# Altium footprint library TarabusLibrary.PcbLib: 591 footprints (part 4 of 37)
Each footprint in its own frame and in the unit in brackets; x right, y up, seen from the top. Pads: shape width x height; smd on the part's side, far side on the other; paste and mask are expansions set on the pad; w line width, h text height; cw(c..) or ccw(c..) is an arc to the next point about the centre after c.
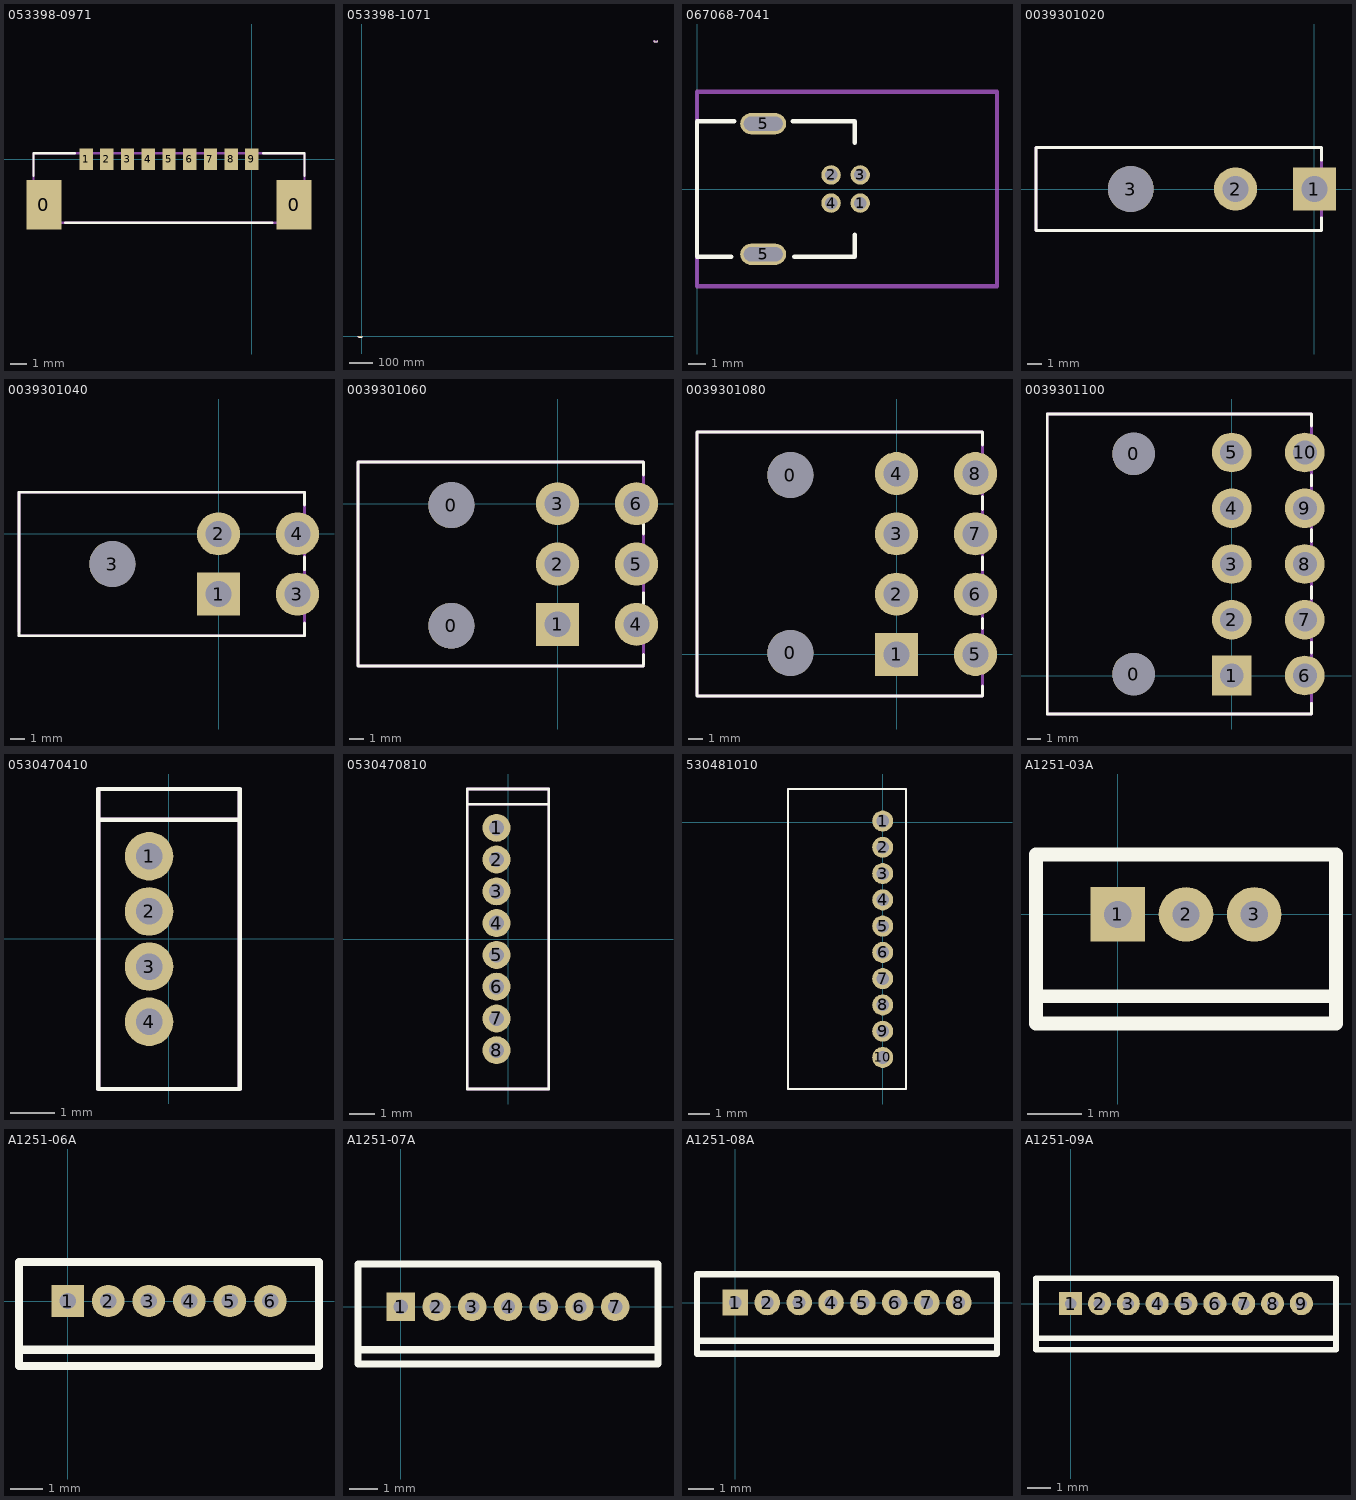
[diagram p3: the footprints below, top view; thin cyan lines are the x and y axes]

## 053398-0971 [mm]
pads (12):
  rect 2.1x3 smd: 0(-12.55,-2.75) 0(2.55,-2.75)
  rect 0.8x1.3 smd: 1(-10,0) 2(-8.75,0) 3(-7.5,0) 4(-6.25,0) 4(-6.25,0) 5(-5,0) 6(-3.75,0) 7(-2.5,0) 8(-1.25,0) 9(0,0)
Top Overlay:
  lines w0.15: -13.175,-1 -13.175,0.35 -10.7,0.35 ; -11.25,-3.85 1.225,-3.85 ; 0.7,0.35 3.175,0.35 3.175,-1
Mechanical 7:
  lines w0.15: -13.175,-3.85 -13.175,0.35 3.175,0.35 3.175,-3.85 -13.175,-3.85
Mechanical 10:
  text ".Designator" at -4.875,1.75 h0.8
  text ".Comment" at -4.85,1.175 h0.6

## 053398-1071 [mm]
pads (25):
  rect 2.1x3 smd: 0(-13.8,-2.75) 0(2.55,-2.75) 0(1256.2,1267.25) 0(1271.3,1267.25)
  rect 0.8x1.3 smd: 1(-11.25,0) 1(1258.75,1270) 2(-10,0) 2(1260,1270) 3(-8.75,0) 3(1261.25,1270) 4(-7.5,0) 4(-7.5,0) 4(1262.5,1270) 4(1262.5,1270) 5(-6.25,0) 5(1263.75,1270) 6(-5,0) 6(1265,1270) 7(-3.75,0) 7(1266.25,1270) 8(-2.5,0) 8(1267.5,1270) 9(-1.25,0) 9(1268.75,1270) 10(0,0)
Top Overlay:
  lines w0.15: -14.425,-1 -14.425,0.35 -11.95,0.35 ; -12.5,-3.85 1.2,-3.85 ; 0.675,0.35 3.2,0.35 3.2,-1 ; 1255.575,1269 1255.575,1270.35 1258.05,1270.35 ; 1257.5,1266.15 1269.975,1266.15 ; 1269.45,1270.35 1271.925,1270.35 1271.925,1269
Mechanical 7:
  lines w0.15: -14.425,-3.85 -14.425,0.35 3.2,0.35 3.2,-3.85 -14.425,-3.85 ; 1255.575,1266.15 1271.925,1266.15 1271.925,1270.35 1255.575,1270.35 1255.575,1266.15
Mechanical 10:
  text ".Comment" at 1263.9,1271.175 h0.6
  text ".Designator" at 1263.875,1271.75 h0.8
  text ".Designator" at -6.125,1.75 h0.8
  text ".Comment" at -6.1,1.175 h0.6

## 067068-7041 [mm]
height 3.9
pads (6):
  round 1.1 hole 0.7: 1(9.25,-0.8) 2(7.6,0.8) 3(9.25,0.8) 4(7.6,-0.8)
  oval 2.6x1.2 hole 0.8 slot 2.2 at 0 deg: 5(3.75,-3.7) 5(3.75,3.7)
Top Overlay:
  lines w0.254: 1.95,-3.85 0,-3.85 0,3.85 2.1,3.85 ; 5.425,3.85 8.95,3.85 8.95,2.625 ; 5.5,-3.85 8.95,-3.85 8.95,-2.6
Mechanical 7:
  lines w0.254: 0,-5.5 0,5.5 17,5.5 17,-5.5 0,-5.5
3D body: height 3.9, standoff 0, extent 0.001,-3.849 8.949,3.849

## 0039301020 [mm]
pads (3):
  rect 3x3 hole 1.8 mask+0: 1(0,0)
  round 3 hole 1.8 mask+0: 2(-5.5,0)
  round 3.2 hole 3.2 mask+0: 3(-12.8,0)
Top Overlay:
  lines w0.2: 0.5,-2 0.5,-2.9 -19.4,-2.9 -19.4,2.9 0.5,2.9 0.5,2
Mechanical 7:
  lines w0.2: -19.4,-2.9 -19.4,2.9 0.5,2.9 0.5,-2.9 -19.4,-2.9
Mechanical 10:
  text ".Comment" at -2,-3.6 h0.6
  text ".Designator" at -2.67,3.04 h0.8
3D body "026013101.stp": height 11.4, standoff -3.6, extent -19.435,-2.9 0.5,2.9

## 0039301040 [mm]
pads (5):
  rect 3x3 hole 1.8 mask+0: 1(0,-4.2)
  round 3 hole 1.8 mask+0: 2(0,0) 3(5.5,-4.2) 4(5.5,0)
  round 3.2 hole 3.2 mask+0: 3(-7.4,-2.1)
Top Overlay:
  lines w0.2: 6,-6.2 6,-7.1 -13.9,-7.1 -13.9,2.9 6,2.9 6,2 ; 6,-2.5 6,-1.6
Mechanical 7:
  lines w0.2: -13.9,-7.1 6,-7.1 6,2.9 -13.9,2.9 -13.9,-6.8
Mechanical 10:
  text ".Designator" at 2.83,3.74 h0.8
  text ".Comment" at -0.325,4.2 h0.6

## 0039301060 [mm]
pads (8):
  round 3.2 hole 3.2 mask+0: 0(-7.4,-8.5) 0(-7.4,-0.1)
  rect 3x3 hole 1.8 mask+0: 1(0,-8.4)
  round 3 hole 1.8 mask+0: 2(0,-4.2) 3(0,0) 4(5.5,-8.4) 5(5.5,-4.2) 6(5.5,0)
Top Overlay:
  lines w0.2: 6,-11.3 -13.9,-11.3 -13.9,2.9 6,2.9 6,2 ; 6,-11.2 6,-10.5 ; 6,-7.1 6,-6.2 ; 6,-2.1 6,-1.2
Mechanical 7:
  lines w0.2: -13.9,-11.3 6,-11.3 6,2.9 -13.9,2.9 -13.9,-11.3
Mechanical 10:
  text ".Designator" at 2.83,3.74 h0.8
  text ".Comment" at -0.325,4.2 h0.6

## 0039301080 [mm]
pads (10):
  round 3.2 hole 3.2 mask+0: 0(-7.4,0.1) 0(-7.4,12.5)
  rect 3x3 hole 1.8 mask+0: 1(0,0)
  round 3 hole 1.8 mask+0: 2(0,4.2) 3(0,8.4) 4(0,12.6) 5(5.5,0) 6(5.5,4.2) 7(5.5,8.4) 8(5.5,12.6)
Top Overlay:
  lines w0.2: 6,-2.2 6,-2.9 1.8,-2.9 -13.9,-2.9 -13.9,15.5 6,15.5 6,14.6 ; 6,1.8 6,2.5 ; 6,5.9 6,6.8 ; 6,10.1 6,11
Mechanical 7:
  lines w0.2: -13.9,-2.9 6,-2.9 6,15.5 -13.9,15.5 -13.9,-2.9
Mechanical 10:
  text ".Designator" at 2.83,16.34 h0.8
  text ".Comment" at -0.325,16.8 h0.6

## 0039301100 [mm]
pads (12):
  round 3.2 hole 3.2 mask+0: 0(-7.4,0.1) 0(-7.4,16.7)
  rect 3x3 hole 1.8 mask+0: 1(0,0)
  round 3 hole 1.8 mask+0: 2(0,4.2) 3(0,8.4) 4(0,12.6) 5(0,16.8) 6(5.5,0) 7(5.5,4.2) 8(5.5,8.4) 9(5.5,12.6) 10(5.5,16.8)
Top Overlay:
  lines w0.2: 6,-2.1 6,-2.9 -13.9,-2.9 -13.9,19.7 6,19.7 6,18.8 ; 6,1.7 6,2.5 ; 6,5.8 6,6.7 ; 6,10.1 6,11 ; 6,14.3 6,15.1
Mechanical 7:
  lines w0.2: -13.9,-2.9 6,-2.9 6,19.7 -13.9,19.7 -13.9,-2.9
Mechanical 10:
  text ".Designator" at 2.83,20.54 h0.8
  text ".Comment" at -0.325,21 h0.6

## 0530470410 [mm]
pads (4):
  round 1.1 hole 0.6 mask+0: 1(-0.45,1.875) 2(-0.45,0.625) 3(-0.45,-0.625) 4(-0.45,-1.875)
Top Overlay:
  lines w0.1: -1.6,2.7 1.6,2.7 ; -1.6,-3.4 1.6,-3.4 1.6,3.4 -1.6,3.4 -1.6,-3.4
Mechanical 7:
  lines w0.1: -1.6,2.7 1.6,2.7 ; -1.6,-3.4 -1.6,3.4 1.6,3.4 1.6,-3.4 -1.6,-3.4
3D body "530470410.stp": height 4.1, standoff -2.3, extent -1.6,-3.375 1.6,3.375

## 0530470810 [mm]
pads (8):
  round 1.1 hole 0.6 mask+0: 1(-0.45,4.375) 2(-0.45,3.125) 3(-0.45,1.875) 4(-0.45,0.625) 5(-0.45,-0.625) 6(-0.45,-1.875) 7(-0.45,-3.125) 8(-0.45,-4.375)
Top Overlay:
  lines w0.1: -1.6,5.3 1.6,5.3 ; -1.6,-5.9 1.6,-5.9 1.6,5.9 -1.6,5.9 -1.6,-5.9
Mechanical 7:
  lines w0.1: -1.6,5.3 1.6,5.3 ; -1.6,-5.9 -1.6,5.9 1.6,5.9 1.6,-5.9 -1.6,-5.9
3D body "530470810.stp": height 4.1, standoff -2.3, extent -1.6,-5.875 1.6,5.875

## 530481010 [mm]
pads (10):
  round 1 hole 0.6 mask+0: 1(0,0.05) 2(0,-1.2) 3(0,-2.45) 4(0,-3.7) 5(0,-4.95) 6(0,-6.2) 7(0,-7.45) 8(0,-8.7) 9(0,-9.95) 10(0,-11.2)
Top Overlay:
  lines w0.1: -4.5,-12.7 1.1,-12.7 1.1,1.575 -4.5,1.575 -4.5,-12.7
Mechanical 7:
  lines w0.1: -4.5,-12.7 -4.5,1.575 1.1,1.575 1.1,-12.7 -4.5,-12.7
3D body "5738.stp": height 3.55, standoff -2.25, extent -4.45,-12.625 1.05,1.625

## A1251-03A [mm]
pads (3):
  rect 1x1 hole 0.5 mask+0: 1(0,0)
  round 1 hole 0.5 mask+0: 2(1.25,0) 3(2.5,0)
Top Overlay:
  lines w0.254: -1.5,-1.5 4,-1.5 ; -1.5,-2 4,-2 4,1.1 -1.5,1.1 -1.5,-2
3D body "530470310.stp": height 4.1, standoff -2.3, extent -1.5,-2.1 4,1.1

## A1251-06A [mm]
pads (6):
  rect 1x1 hole 0.5 mask+0: 1(0,0)
  round 1 hole 0.5 mask+0: 2(1.25,0) 3(2.5,0) 4(3.75,0) 5(5,0) 6(6.25,0)
Top Overlay:
  lines w0.254: -1.5,-1.5 7.75,-1.5 ; -1.5,-2 7.75,-2 7.75,1.2 -1.5,1.2 -1.5,-2
3D body "530470610.stp": height 4.1, standoff -2.3, extent -1.425,-2.1 7.825,1.1

## A1251-07A [mm]
pads (7):
  rect 1x1 hole 0.5 mask+0: 1(0,0)
  round 1 hole 0.5 mask+0: 2(1.25,0) 3(2.5,0) 4(3.75,0) 5(5,0) 6(6.25,0) 7(7.5,0)
Top Overlay:
  lines w0.254: -1.5,-1.5 9,-1.5 ; -1.5,-2 9,-2 9,1.5 -1.5,1.5 -1.5,-2
3D body: height 8, standoff 0, extent -1.5,-2 9,1.5

## A1251-08A [mm]
pads (8):
  rect 1x1 hole 0.5 mask+0: 1(0,0)
  round 1 hole 0.5 mask+0: 2(1.25,0) 3(2.5,0) 4(3.75,0) 5(5,0) 6(6.25,0) 7(7.5,0) 8(8.75,0)
Top Overlay:
  lines w0.254: -1.5,-1.5 10.2,-1.5 ; -1.5,-2 10.25,-2 10.25,1.1 -1.5,1.1 -1.5,-2
3D body "530470810.stp": height 4.1, standoff -2.3, extent -1.475,-2.1 10.275,1.1

## A1251-09A [mm]
pads (9):
  rect 1x1 hole 0.5 mask+0: 1(0,0)
  round 1 hole 0.5 mask+0: 2(1.25,0) 3(2.5,0) 4(3.75,0) 5(5,0) 6(6.25,0) 7(7.5,0) 8(8.75,0) 9(10,0)
Top Overlay:
  lines w0.254: -1.5,-1.5 11.5,-1.5 ; -1.5,-2 -1.5,1.1 11.5,1.1 11.5,-2 -1.5,-2
3D body "530470910.stp": height 4.1, standoff -2.3, extent -1.45,-2.125 11.55,1.075